# Altium footprint library Amirreza.PcbLib: 524 footprints (part 29 of 33)
Each footprint in its own frame and in the unit in brackets; x right, y up, seen from the top. Pads: shape width x height; smd on the part's side, far side on the other; paste and mask are expansions set on the pad; w line width, h text height; cw(c..) or ccw(c..) is an arc to the next point about the centre after c.
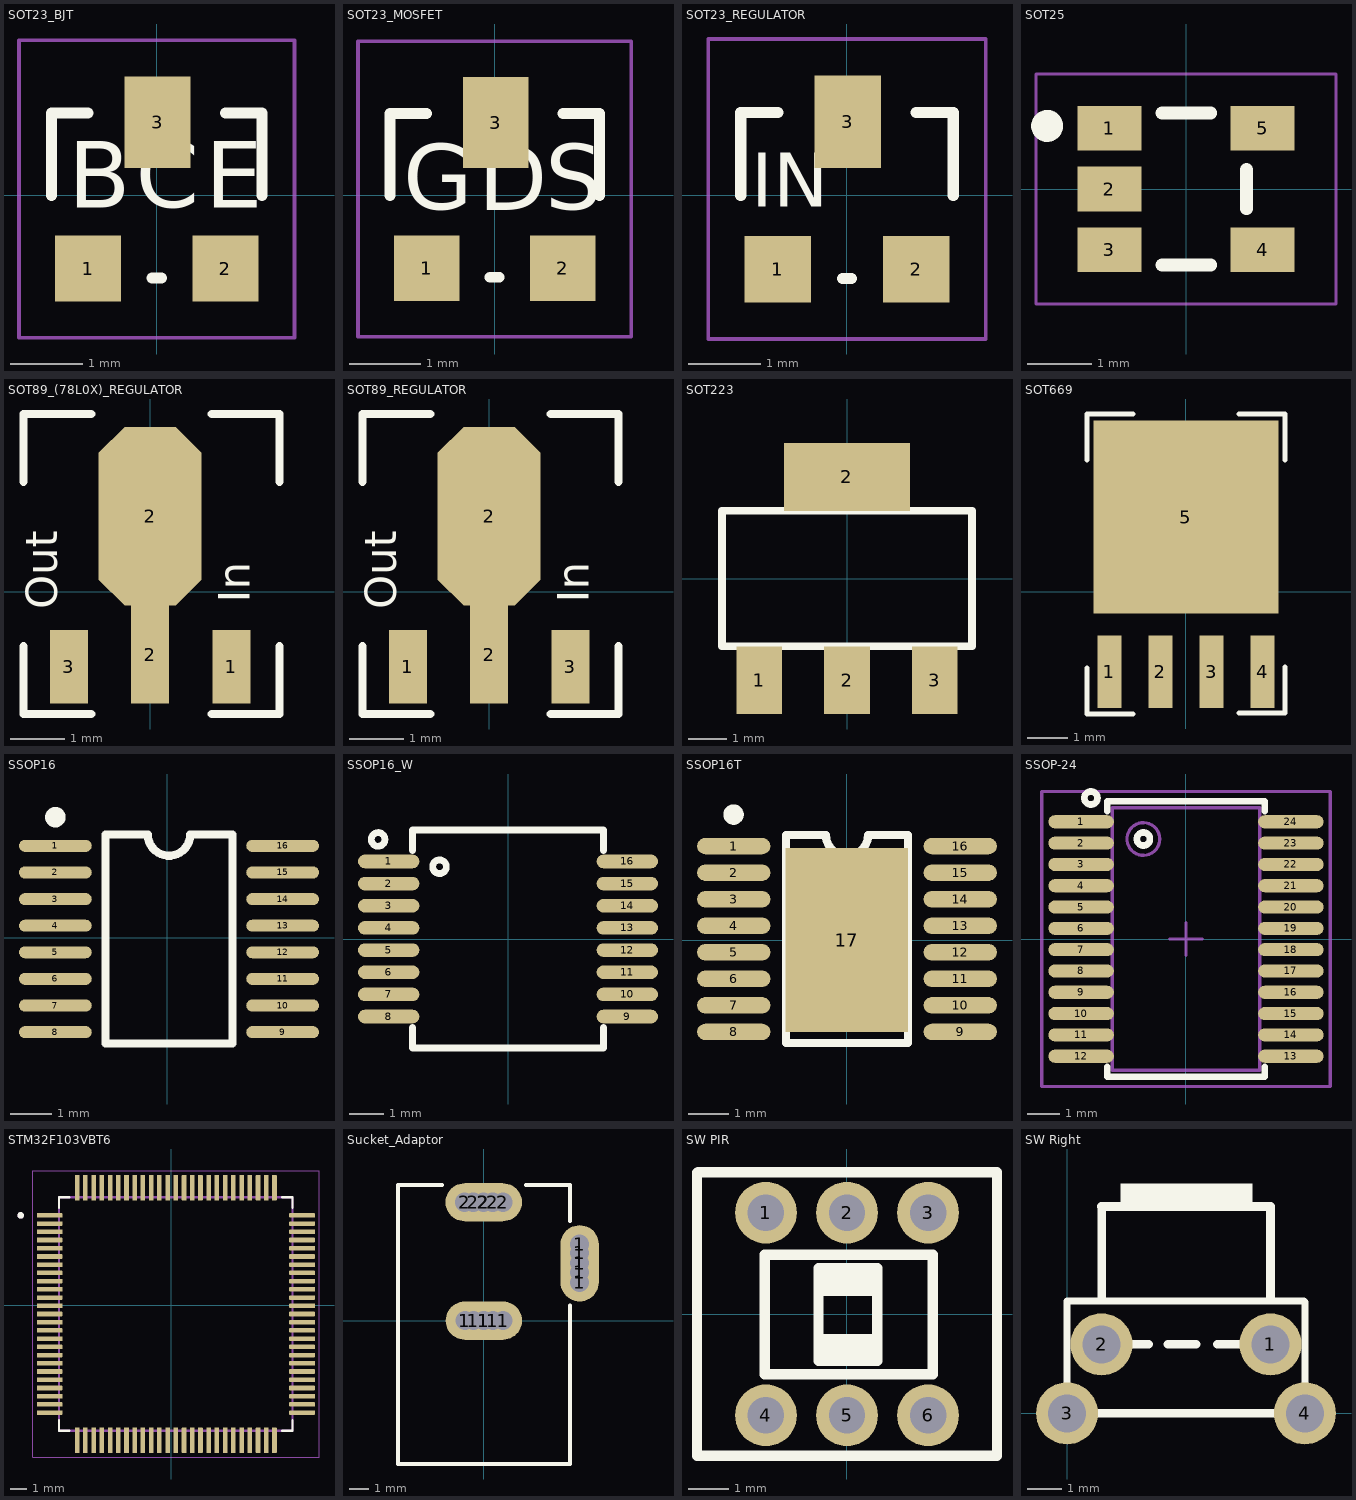
[diagram p28: the footprints below, top view; thin cyan lines are the x and y axes]

## SOT23_BJT [mil]
pads (3):
  rect 36x36 smd: 1(-37.5,-40) 2(37.5,-40)
  rect 36x50 smd: 3(0.5,40)
Top Overlay:
  lines w6: -57.5,0 -57.5,45 -37.5,45 ; -2.5,-45 2.5,-45 ; 37.5,45 57.5,45 57.5,0
  text "C" at -11.43,-18.4 h62
  text "E" at 26.57,-18.61 h62
  text "B" at -48.43,-18.61 h62
Mechanical 13:
  lines w1.97: -75.18,-77.68 75.18,-77.68 75.18,84.69 -75.18,84.69 -75.18,-77.68
3D body "CircuitWorks-SOT-23.step": height 41.65, standoff -1.65, extent -59.06,-49.21 59.06,49.21

## SOT23_MOSFET [mil]
pads (3):
  rect 36x36 smd: 1(-37.5,-40) 2(37.5,-40)
  rect 36x50 smd: 3(0.5,40)
Top Overlay:
  lines w6: -57.5,0 -57.5,45 -37.5,45 ; -2.5,-45 2.5,-45 ; 37.5,45 57.5,45 57.5,0
  text "G" at -50.38,-19.35 h62
  text "S" at 27.78,-19.35 h62
  text "D" at -9.04,-19.92 h62
Mechanical 13:
  lines w1.97: -75.18,-77.68 -75.18,84.69 75.18,84.69 75.18,-77.68 -75.18,-77.68
3D body "CircuitWorks-SOT-23.step": height 41.65, standoff -1.65, extent -59.06,-49.21 59.06,49.21

## SOT23_REGULATOR [mil]
pads (3):
  rect 36x36 smd: 1(-37.5,-40) 2(37.5,-40)
  rect 36x50 smd: 3(0.5,40)
Top Overlay:
  lines w6: -57.5,0 -57.5,45 -37.5,45 ; -2.5,-45 2.5,-45 ; 37.5,45 57.5,45 57.5,0
  text "IN" at -51.89,-15.97 h50
Mechanical 13:
  lines w1.97: -75.18,-77.68 -75.18,84.69 75.18,84.69 75.18,-77.68 -75.18,-77.68
3D body "CircuitWorks-SOT-23.step": height 41.65, standoff -1.65, extent -59.06,-49.21 59.06,49.21

## SOT25 [mm] "SOT23, 5-Leads, Body 2.9x1.6mm, Pitch 0.95mm, Lead Span 2.8mm, IPC Low Density"
height 1.19
pads (5):
  rect 1x0.7 smd: 1(-1.2,0.95) 2(-1.2,0) 3(-1.2,-0.95) 4(1.2,-0.95) 5(1.2,0.95)
Top Overlay:
  circle w0.25: c-2.176,0.988 r0.125
  lines w0.2: -0.378,-1.19 0.388,-1.19 ; -0.378,1.19 0.388,1.19 ; 0.946,-0.31 0.946,0.305
Mechanical 13:
  lines w0.05: -2.35,-1.8 -2.35,1.8 2.35,1.8 2.35,-1.8 -2.35,-1.8
3D body "User Library-sot25.STEP": height 1.15, standoff 0, extent -1.2,-1.5 1.2,1.5

## SOT89_(78L0X)_REGULATOR [mm]
height 0.55
pads (4):
  rect 0.7x1.35 smd: 1(1.5,-1.387) 3(-1.5,-1.387)
  rect 0.7x1.8 smd: 2(0,-1.162)
  oct 1.9x3.3 smd: 2(0,1.388)
Top Overlay:
  lines w0.152: -2.337,-1.011 -2.337,-2.261 -1.087,-2.261 ; -2.337,2.027 -2.337,3.277 -1.087,3.277 ; 1.138,-2.261 2.388,-2.261 2.388,-1.011 ; 1.138,3.277 2.388,3.277 2.388,2.027
  text "Out" at -1.524,-0.331 h1
  text "In" at 2.032,-0.204 h1
3D body "User Library-SOT-89-1.step": height 1.51, standoff 0, extent -2.224,-1.676 2.276,2.624

## SOT89_REGULATOR [mm]
pads (4):
  rect 0.7x1.35 smd: 1(-1.5,-1.387) 3(1.5,-1.387)
  rect 0.7x1.8 smd: 2(0,-1.162)
  oct 1.9x3.3 smd: 2(0,1.388)
Top Overlay:
  lines w0.152: -2.337,-1.011 -2.337,-2.261 -1.087,-2.261 ; -2.337,2.027 -2.337,3.277 -1.087,3.277 ; 1.138,-2.261 2.388,-2.261 2.388,-1.011 ; 1.138,3.277 2.388,3.277 2.388,2.027
  text "In" at 2.032,-0.204 h1
  text "Out" at -1.524,-0.331 h1
3D body "User Library-SOT-89-1.step": height 1.51, standoff 0, extent -2.224,-1.676 2.276,2.624

## SOT223 [mm]
pads (4):
  rect 1.2x1.775 smd: 1(-2.3,-2.663) 2(0,-2.663) 3(2.3,-2.663)
  rect 3.3x1.775 smd: 2(0,2.663)
Top Overlay:
  lines w0.2: -3.275,-1.775 -3.275,1.775 3.275,1.775 3.275,-1.775 -3.275,-1.775
3D body "CircuitWorks-SOT-223.step": height 1.68, standoff 0, extent -3.25,-3.48 3.25,3.48

## SOT669 [mm]
pads (5):
  rect 0.6x1.8 smd: 1(-1.905,-2) 2(-0.635,-2) 3(0.635,-2) 4(1.905,-2)
  rect 4.6x4.8 smd: 5(0,1.855)
Top Overlay:
  lines w0.127: -2.464,-1.905 -2.464,-3.048 -1.321,-3.048 ; -2.464,3.277 -2.464,4.42 -1.321,4.42 ; 1.321,-3.023 2.464,-3.023 2.464,-1.88 ; 1.321,4.42 2.464,4.42 2.464,3.277
3D body "User Library-SOT669-CW.step": height 1.2, standoff 0, extent -2.45,-2.54 2.45,3.888

## SSOP16 [mil]
pads (16):
  oval 70x11.5 smd: 1(-107.52,88.15) 2(-107.52,62.56) 3(-107.52,36.97) 4(-107.52,11.38) 5(-107.52,-14.21) 6(-107.52,-39.8) 7(-107.52,-65.39) 8(-107.52,-90.98) 9(110.98,-90.98) 10(110.98,-65.39) 11(110.98,-39.8) 12(110.98,-14.21) 13(110.98,11.38) 14(110.98,36.97) 15(110.98,62.56) 16(110.98,88.15)
Top Overlay:
  circle w9.84: c-107.52,115.71 r4.92
  lines w7.87: -59.29,-101.81 62.76,-101.81 62.76,98.98 22.07,98.98 cw(c1.73,98.98) -18.61,98.98 -59.29,98.98 -59.29,-101.81
3D body "User Library-TSSOP-16-1.step": height 43.31, standoff 0, extent -123.21,-100.81 128.76,96.04

## SSOP16_W [mm] "SSOP16, SOT338-1, SOT403-1, RU-16, pitch: 0.65mm, 6x5.3mm, GN16, MO-150AC"
pads (16):
  oval 1.8x0.4 smd mask+0.075: 1(-3.5,2.275) 2(-3.5,1.625) 3(-3.5,0.975) 4(-3.5,0.325) 5(-3.5,-0.325) 6(-3.5,-0.975) 7(-3.5,-1.625) 8(-3.5,-2.275) 9(3.5,-2.275) 10(3.5,-1.625) 11(3.5,-0.975) 12(3.5,-0.325) 13(3.5,0.325) 14(3.5,0.975) 15(3.5,1.625) 16(3.5,2.275)
Top Overlay:
  circle w0.2: c-3.81,2.92 r0.2
  circle w0.2: c-2.01,2.12 r0.2
  lines w0.2: -2.8,-2.6 -2.8,-3.2 2.8,-3.2 2.8,-2.6 ; -2.8,2.6 -2.8,3.2 2.8,3.2 2.8,2.6
3D body "User Library-SSOP-16.STEP": height 1.9, standoff 0, extent -3.9,-3.1 3.9,3.1

## SSOP16T [mm]
pads (17):
  oval 1.8x0.4 smd: 1(-2.764,2.3) 2(-2.764,1.65) 3(-2.764,1) 4(-2.764,0.35) 5(-2.764,-0.3) 6(-2.764,-0.95) 7(-2.764,-1.6) 8(-2.764,-2.25) 9(2.786,-2.25) 10(2.786,-1.6) 11(2.786,-0.95) 12(2.786,-0.3) 13(2.786,0.35) 14(2.786,1) 15(2.786,1.65) 16(2.786,2.3)
  rect 3x4.5 smd: 17(0,0)
Top Overlay:
  circle w0.25: c-2.769,3.073 r0.125
  lines w0.2: -1.483,-2.525 1.5,-2.525 1.505,-2.52 1.505,2.575 0.527,2.575 cw(c0.011,2.575) -0.506,2.575 -1.483,2.575 -1.483,-2.525
3D body "User Library-TSSOP-16-1.step": height 1.1, standoff 0, extent -3.2,-2.5 3.2,2.5

## SSOP-24 [mm] "PW TSSOP (TI), MO-153-AD (JEDEC), 24Lead, pitch: 0.65mm, 8x4.4x1.2mm"
height 1.2
pads (24):
  oval 2x0.4 smd mask+0.102: 1(-3.2,3.575) 2(-3.2,2.925) 3(-3.2,2.275) 4(-3.2,1.625) 5(-3.2,0.975) 6(-3.2,0.325) 7(-3.2,-0.325) 8(-3.2,-0.975) 9(-3.2,-1.625) 10(-3.2,-2.275) 11(-3.2,-2.925) 12(-3.2,-3.575) 13(3.2,-3.575) 14(3.2,-2.925) 15(3.2,-2.275) 16(3.2,-1.625) 17(3.2,-0.975) 18(3.2,-0.325) 19(3.2,0.325) 20(3.2,0.975) 21(3.2,1.625) 22(3.2,2.275) 23(3.2,2.925) 24(3.2,3.575)
Top Overlay:
  circle w0.2: c-2.9,4.3 r0.2
  circle w0.2: c-1.3,3.05 r0.2
  lines w0.2: -2.4,-3.9 -2.4,-4.2 2.4,-4.2 2.4,-3.9 ; -2.4,3.9 -2.4,4.2 2.4,4.2 2.4,3.9
Mechanical 13:
  circle w0.1: c-1.3,3.05 r0.5
  lines w0.1: -2.25,-4 -2.25,4 2.25,4 2.25,-4 -2.25,-4
Mechanical 15:
  lines w0.1: -0.5,0 0.5,0 ; 0,-0.5 0,0.5 ; -4.4,-4.5 -4.4,4.5 4.4,4.5 4.4,-4.5 -4.4,-4.5
3D body "User Library-TSSOP-24.STEP": height 1.2, standoff 0, extent -3.2,-3.9 3.2,3.9

## STM32F103VBT6 [mm]
pads (100):
  rrect25% 1.56x0.28 smd: 1(-7.401,5.467) 2(-7.401,4.967) 3(-7.401,4.467) 4(-7.401,3.967) 5(-7.401,3.467) 6(-7.401,2.967) 7(-7.401,2.467) 8(-7.401,1.967) 9(-7.401,1.467) 10(-7.401,0.967) 11(-7.401,0.467) 12(-7.401,-0.033) 13(-7.401,-0.533) 14(-7.401,-1.033) 15(-7.401,-1.533) 16(-7.401,-2.033) 17(-7.401,-2.533) 18(-7.401,-3.033) 19(-7.401,-3.533) 20(-7.401,-4.033) 21(-7.401,-4.533) 22(-7.401,-5.033) 23(-7.401,-5.533) 24(-7.401,-6.033) 25(-7.401,-6.533) 51(7.959,-6.533) 52(7.959,-6.033) 53(7.959,-5.533) 54(7.959,-5.033) 55(7.959,-4.533) 56(7.959,-4.033) 57(7.959,-3.533) 58(7.959,-3.033) 59(7.959,-2.533) 60(7.959,-2.033) 61(7.959,-1.533) 62(7.959,-1.033) 63(7.959,-0.533) 64(7.959,-0.033) 65(7.959,0.467) 66(7.959,0.967) 67(7.959,1.467) 68(7.959,1.967) 69(7.959,2.467) 70(7.959,2.967) 71(7.959,3.467) 72(7.959,3.967) 73(7.959,4.467) 74(7.959,4.967) 75(7.959,5.467)
  rrect25% 0.28x1.56 smd: 26(-5.721,-8.213) 27(-5.221,-8.213) 28(-4.721,-8.213) 29(-4.221,-8.213) 30(-3.721,-8.213) 31(-3.221,-8.213) 32(-2.721,-8.213) 33(-2.221,-8.213) 34(-1.721,-8.213) 35(-1.221,-8.213) 36(-0.721,-8.213) 37(-0.221,-8.213) 38(0.279,-8.213) 39(0.779,-8.213) 40(1.279,-8.213) 41(1.779,-8.213) 42(2.279,-8.213) 43(2.779,-8.213) 44(3.279,-8.213) 45(3.779,-8.213) 46(4.279,-8.213) 47(4.779,-8.213) 48(5.279,-8.213) 49(5.779,-8.213) 50(6.279,-8.213) 76(6.279,7.147) 77(5.779,7.147) 78(5.279,7.147) 79(4.779,7.147) 80(4.279,7.147) 81(3.779,7.147) 82(3.279,7.147) 83(2.779,7.147) 84(2.279,7.147) 85(1.779,7.147) 86(1.279,7.147) 87(0.779,7.147) 88(0.279,7.147) 89(-0.221,7.147) 90(-0.721,7.147) 91(-1.221,7.147) 92(-1.721,7.147) 93(-2.221,7.147) 94(-2.721,7.147) 95(-3.221,7.147) 96(-3.721,7.147) 97(-4.221,7.147) 98(-4.721,7.147) 99(-5.221,7.147) 100(-5.721,7.147)
Top Overlay:
  circle w0.2: c-9.161,5.467 r0.1
  lines w0.127: -6.821,-6.993 -6.821,-7.633 -6.181,-7.633 ; -6.821,5.927 -6.821,6.567 -6.181,6.567 ; 6.739,-7.633 7.379,-7.633 7.379,-6.993 ; 6.739,6.567 7.379,6.567 7.379,5.927
Mechanical 13:
  circle w0.2: c-9.161,5.467 r0.1
  lines w0.127: -6.821,-7.633 -6.821,6.567 7.379,6.567 7.379,-7.633 -6.821,-7.633
Mechanical 15:
  lines w0.05: -8.431,-9.243 -8.431,8.177 8.989,8.177 8.989,-9.243 -8.431,-9.243
3D body "STM32F103VBT6TR.STEP": height 1.46, standoff -0.14, extent -7.721,-8.508 8.279,7.492

## Sucket_Adaptor [mm]
pads (18):
  round 1.5 hole 1: 1(-1,0) 1(-0.549,0) 1(-0.012,0) 1(0.473,0) 1(1,0) 1(5.009,2) 1(5.009,2.526) 1(5.009,3.012) 1(5.009,3.549) 1(5.009,4) 2(-1.012,6.198) 2(-0.561,6.198) 2(-0.025,6.198) 2(0.461,6.198) 2(0.988,6.198)
  oval 4x2 all layers, no hole: 1(0,0) 2(-0.012,6.198)
  oval 2x4 all layers, no hole: 1(5.009,3)
Top Overlay:
  lines w0.2: -2.191,7.1 -4.491,7.1 -4.491,-7.5 4.509,-7.5 4.509,0.8 ; 2.209,7.1 4.509,7.1 4.509,5.2

## SW PIR [mm]
pads (6):
  round 1.524 hole 0.9: 1(-2,2.5) 2(0,2.5) 3(2,2.5) 4(-2,-2.5) 5(0,-2.5) 6(2,-2.5)
Top Overlay:
  rectangle: -0.73,0.443 0.769,1.078
  region: 0.819,-0.497 -0.679,-0.497 -0.679,-1.081 0.819,-1.081
  lines w0.254: -3.7,-3.5 -3.7,3.491 ; -3.676,-3.5 3.7,-3.5 ; -3.676,3.5 3.7,3.5 ; 3.7,-3.444 3.7,3.491 ; -2.025,-1.488 -2.025,1.459 2.115,1.459 2.115,-1.488 -2.025,-1.488 ; -0.705,-1.158 0.743,-1.158 0.743,1.128 -0.705,1.128 -0.705,-1.158
3D body "User Library-KFC6X6-1.STEP": height 10.2, standoff -3.3, extent -3,-3 3,3

## SW Right [mm]
height 2.65
pads (4):
  round 1.8 hole 1.1: 1(5.9,2) 2(1,2) 3(0,0) 4(6.9,0)
Top Overlay:
  rectangle: 1.554,6 5.379,6.661
  lines w0.2: 0,0 0,3.255 6.875,3.255 6.9,3.23 6.9,0
  lines w0.254: 0,0 6.9,0 ; 1,2 2.372,2 ; 1,6 5.9,6 5.9,3.325 ; 1.004,3.304 1.004,6 ; 2.93,2 3.743,2 ; 4.353,2 5.9,2